# Altium footprint library RDM_ALT_PCB.PcbLib: 171 footprints (part 11 of 11)
Each footprint in its own frame and in the unit in brackets; x right, y up, seen from the top. Pads: shape width x height; smd on the part's side, far side on the other; paste and mask are expansions set on the pad; w line width, h text height; cw(c..) or ccw(c..) is an arc to the next point about the centre after c.
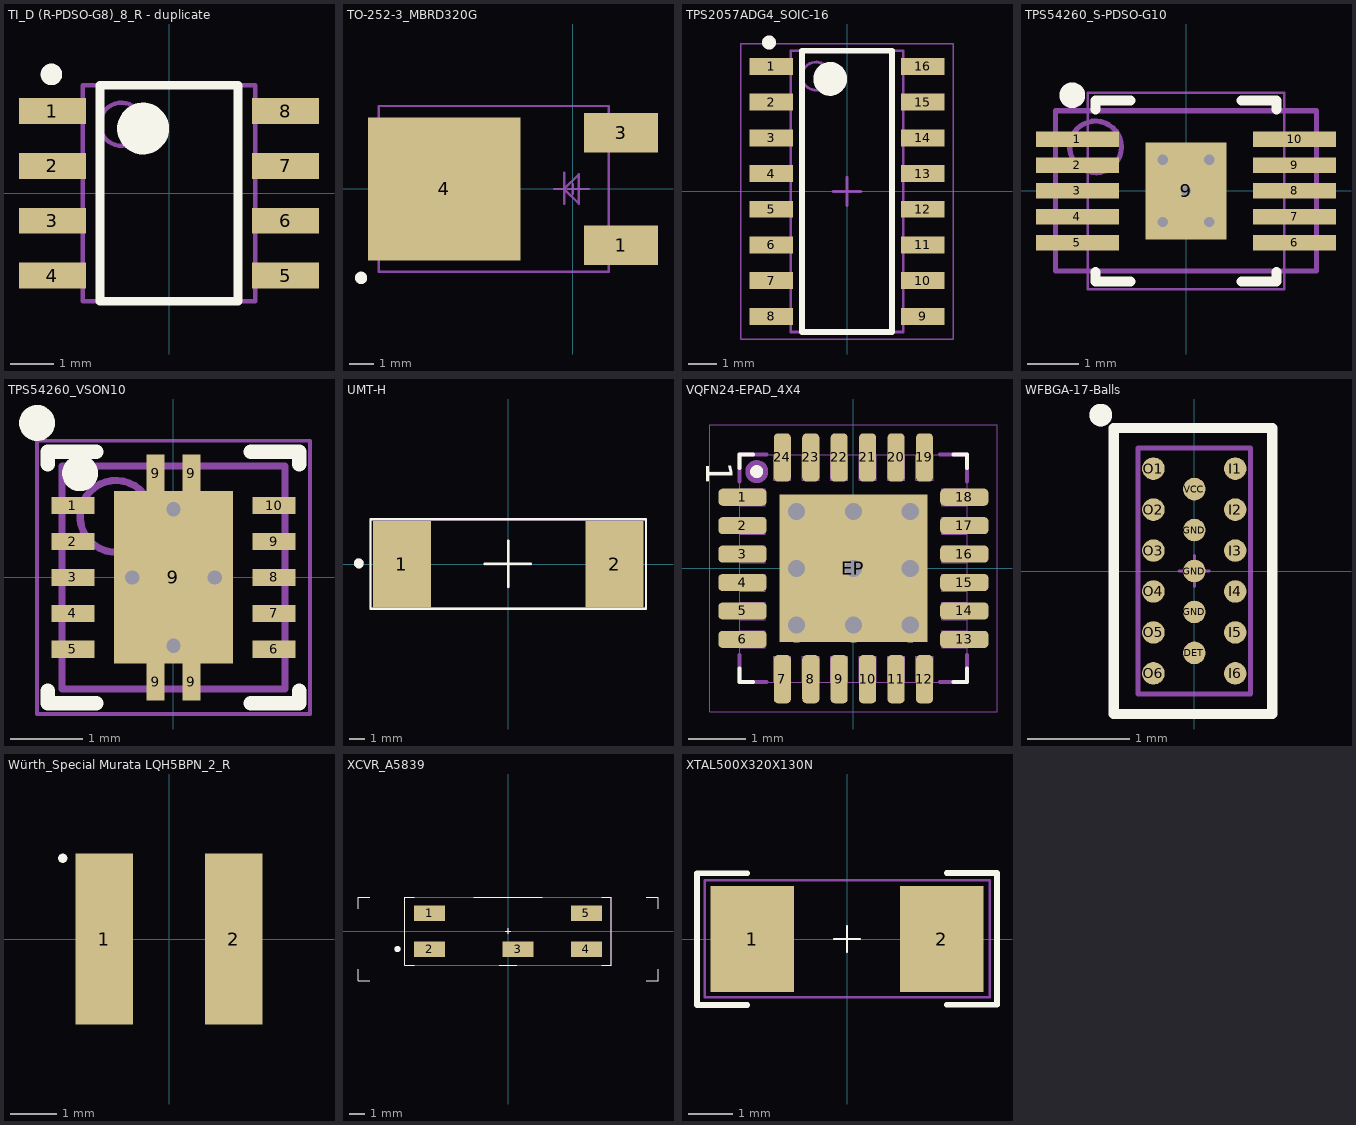
[diagram p10: the footprints below, top view; thin cyan lines are the x and y axes]

## TI_D (R-PDSO-G8)_8_R - duplicate [mm] "TI_D (R-PDSO-G8)_8_R"
height 1.75
pads (8):
  rect 1.55x0.6 smd: 1(-2.7,1.905) 2(-2.7,0.635) 3(-2.7,-0.635) 4(-2.7,-1.905) 5(2.7,-1.905) 6(2.7,-0.635) 7(2.7,0.635) 8(2.7,1.905)
Top Overlay:
  circle w0.6: c-0.6,1.5 r0.3
  circle w0.25: c-2.725,2.755 r0.125
  lines w0.2: -1.6,-2.5 1.6,-2.5 1.6,2.5 -1.6,2.5 -1.6,-2.5
Mechanical 13:
  circle w0.1: c-1.1,1.6 r0.5
  lines w0.1: -2,-2.5 2,-2.5 2,2.5 -2,2.5 -2,-2.5
3D body "SOIC-8akaD0008AakaM08A.stp": height 1.63, standoff 0, extent -3,-2.45 3,2.45

## TO-252-3_MBRD320G [mm] "TO-252-3_MBRD320G"
height 2.47
pads (3):
  rect 3x1.6 smd: 1(1.959,-2.285) 3(1.959,2.285)
  rect 6.2x5.8 smd: 4(-5.221,0)
Top Overlay:
  circle w0.25: c-8.593,-3.607 r0.125
Mechanical 1:
  lines w0.1: -0.2,0 0.2,0 ; 0,-0.2 0,0.2
Mechanical 13:
  lines w0.1: -7.871,-3.363 -7.871,3.369 1.466,3.369 1.466,-3.363 -7.871,-3.363
Mechanical 15:
  lines w0.1: -0.75,0 -0.35,0 ; -0.35,-0.6 -0.35,0.6 -0.35,0.65 ; 0.25,0 0.65,0 ; -0.35,0 0.25,0.6 0.25,-0.6 -0.35,0
3D body "DPAK.step": height 2.44, standoff 0, extent -7.871,-3.363 1.466,3.369

## TPS2057ADG4_SOIC-16 [mm] "SOIC, 16-Leads, Body 10.00x4.00mm, Pitch 1.27mm, IPC Medium Density"
height 1.75
pads (16):
  rect 1.55x0.6 smd: 1(-2.7,4.445) 2(-2.7,3.175) 3(-2.7,1.905) 4(-2.7,0.635) 5(-2.7,-0.635) 6(-2.7,-1.905) 7(-2.7,-3.175) 8(-2.7,-4.445) 9(2.7,-4.445) 10(2.7,-3.175) 11(2.7,-1.905) 12(2.7,-0.635) 13(2.7,0.635) 14(2.7,1.905) 15(2.7,3.175) 16(2.7,4.445)
Top Overlay:
  circle w0.6: c-0.6,4 r0.3
  circle w0.25: c-2.775,5.295 r0.125
  lines w0.2: -1.6,-5 1.6,-5 1.6,5 -1.6,5 -1.6,-5
Mechanical 13:
  circle w0.1: c-1.1,4.1 r0.5
  lines w0.1: -2,-5 2,-5 2,5 -2,5 -2,-5
Mechanical 15:
  lines w0.05: -3.775,-5.25 3.775,-5.25 3.775,5.25 -3.775,5.25 -3.775,-5.25
  lines w0.1: -0.5,0 0.5,0 ; 0,-0.5 0,0.5
3D body "D16.stp": height 1.76, standoff 0, extent -3.099,-5.004 3.099,5.004

## TPS54260_S-PDSO-G10 [mm] "PSO Package  10-Pin"
height 1.1
pads (11):
  rect 1.6x0.3 smd paste-0.025 mask+0.07: 1(-2.1,1) 2(-2.1,0.5) 3(-2.1,0) 4(-2.1,-0.5) 5(-2.1,-1) 6(2.1,-1) 7(2.1,-0.5) 8(2.1,0) 9(2.1,0.5) 10(2.1,1)
  rect 1.57x1.88 smd: 9(0,0)
via 0.45,0.6 diameter 0.3 hole 0.2
via 0.45,-0.6 diameter 0.3 hole 0.2
via -0.45,-0.6 diameter 0.3 hole 0.2
via -0.45,0.6 diameter 0.3 hole 0.2
via 0,0 diameter 0.3 hole 0.2
Top Overlay:
  circle w0.25: c-2.2,1.85 r0.125
  lines w0.2: -1.75,-1.575 -1.75,-1.75 -1.075,-1.75 ; -1.75,1.575 -1.75,1.75 -1.075,1.75 ; 1.075,-1.75 1.75,-1.75 1.75,-1.575 ; 1.075,1.75 1.75,1.75 1.75,1.575
Mechanical 13:
  circle w0.1: c-1.75,0.85 r0.5
  lines w0.1: -2.525,-1.55 2.525,-1.55 2.525,1.55 -2.525,1.55 -2.525,-1.55
Mechanical 15:
  lines w0.05: -1.9,-1.9 1.9,-1.9 1.9,1.9 -1.9,1.9 -1.9,-1.9
  lines w0.1: -0.5,0 0.5,0 ; 0,-0.5 0,0.5
3D body "DGQ10_1P88X1P57.step": height 1.7, standoff 0, extent -2.525,-1.55 2.525,1.55

## TPS54260_VSON10 [mm] "DRC Package  10-Pin VSON"
height 1
pads (15):
  rect 0.6x0.24 smd mask+0.07: 1(-1.4,1) 2(-1.4,0.5) 3(-1.4,0) 4(-1.4,-0.5) 5(-1.4,-1) 6(1.4,-1) 7(1.4,-0.5) 8(1.4,0) 9(1.4,0.5) 10(1.4,1)
  rect 0.25x0.52 smd mask+0.07: 9(-0.25,-1.45) 9(-0.25,1.45) 9(0.25,-1.45) 9(0.25,1.45)
  rect 1.65x2.4 smd: 9(0,0)
via 0.575,0 diameter 0.3 hole 0.2
via 0,0.95 diameter 0.3 hole 0.2
via 0,-0.95 diameter 0.3 hole 0.2
via -0.575,0 diameter 0.3 hole 0.2
Top Overlay:
  circle w0.25: c-1.3,1.45 r0.125
  circle w0.25: c-1.9,2.15 r0.125
  lines w0.2: -1.75,-1.575 -1.75,-1.75 -1.075,-1.75 ; -1.75,1.575 -1.75,1.75 -1.075,1.75 ; 1.075,-1.75 1.75,-1.75 1.75,-1.575 ; 1.075,1.75 1.75,1.75 1.75,1.575
Mechanical 13:
  circle w0.1: c-0.8,0.85 r0.5
  lines w0.1: -1.55,-1.55 -1.55,1.55 1.55,1.55 1.55,-1.55 -1.55,-1.55
Mechanical 15:
  lines w0.05: -1.9,-1.9 -1.9,1.9 1.9,1.9 1.9,-1.9 -1.9,-1.9
  lines w0.1: -0.5,0 0.5,0 ; 0,-0.5 0,0.5
3D body "DRC10_2P4X1P65.stp": height 1, standoff 0, extent -1.55,-1.55 1.55,1.55

## UMT-H [mm]
pads (2):
  rect 3.75x5.6 smd: 1(-6.875,0) 2(6.875,0)
Top Overlay:
  circle w0.54: c-9.663,0.054 r0.05
  lines w0.15: -8.9,-2.89 8.9,-2.89 8.9,2.89 ; -8.9,-2.88 -8.9,2.91 8.9,2.91 ; -1.53,0.03 1.47,0.03 ; -0.01,-1.47 -0.01,1.53
Mechanical 13:
  circle w0.54: c-9.66,0.05 r0.05
Mechanical 15:
  circle w0.54: c-9.663,0.054 r0.05
  lines w0.15: -1.53,0 1.47,0 ; -0.01,-1.5 -0.01,1.5 ; -8.9,-2.89 -8.9,2.91 8.9,2.91 8.9,-2.89 -8.9,-2.89
3D body "e_0100.3446d003.step": height 5.36, standoff 0, extent -8.05,-2.675 8.15,2.675

## VQFN24-EPAD_4X4 [mm] "Transceiver Ethernet 24-SQFN"
height 1
pads (25):
  rrect50% 0.85x0.3 smd mask+0.05: 1(-1.95,1.25) 2(-1.95,0.75) 3(-1.95,0.25) 4(-1.95,-0.25) 5(-1.95,-0.75) 6(-1.95,-1.25) 13(1.95,-1.25) 14(1.95,-0.75) 15(1.95,-0.25) 16(1.95,0.25) 17(1.95,0.75) 18(1.95,1.25)
  rrect50% 0.3x0.85 smd mask+0.05: 7(-1.25,-1.95) 8(-0.75,-1.95) 9(-0.25,-1.95) 10(0.25,-1.95) 11(0.75,-1.95) 12(1.25,-1.95) 19(1.25,1.95) 20(0.75,1.95) 21(0.25,1.95) 22(-0.25,1.95) 23(-0.75,1.95) 24(-1.25,1.95)
  rect 2.6x2.6 smd paste-10 mask+0.05: EP(0,0)
via 0,0 diameter 0.6 hole 0.3
via -1,0 diameter 0.6 hole 0.3
via -1,1 diameter 0.6 hole 0.3
via 0,1 diameter 0.6 hole 0.3
via 1,1 diameter 0.6 hole 0.3
via 1,0 diameter 0.6 hole 0.3
via 1,-1 diameter 0.6 hole 0.3
via 0,-1 diameter 0.6 hole 0.3
via -1,-1 diameter 0.6 hole 0.3
Top Overlay:
  circle w0.178: c-1.7,1.7 r0.025
  lines w0.07: -2,-1.763 -2,-2 -1.763,-2 ; -2,1.763 -2,2 -1.762,2 ; 1.763,-2 2,-2 2,-1.763 ; 1.763,2 2,2 2,1.763
  text "1" at -2.75,1.877 h0.8
Top Paste:
  rectangle: -0.875,-0.875 -0.125,-0.125
  rectangle: 0.125,-0.875 0.875,-0.125
  rectangle: 0.125,0.125 0.875,0.875
  rectangle: -0.875,0.125 -0.125,0.875
Mechanical 13:
  circle w0.254: c-1.7,1.7 r0.075
  lines w0.01: -2.525,-2.525 -2.525,2.525 2.525,2.525 2.525,-2.525 -2.525,-2.525
  lines w0.05: -0.238,0 0.238,0 ; 0,-0.238 0,0.238
  lines w0.07: -2,-1.525 -2,-2 -1.525,-2 ; -2,1.525 -2,2 -1.525,2 ; 1.525,-2 2,-2 2,-1.525 ; 1.525,2 2,2 2,1.525
Mechanical 15:
  circle w0.254: c-1.7,1.7 r0.075
  lines w0.01: -2,-1.4 -1.55,-1.4 -1.55,-1.1 -2,-1.1 ; -2,-0.9 -1.55,-0.9 -1.55,-0.6 -2,-0.6 ; -2,-0.4 -1.55,-0.4 -1.55,-0.1 -2,-0.1 ; -2,0.1 -1.55,0.1 -1.55,0.4 -2,0.4 ; -2,0.6 -1.55,0.6 -1.55,0.9 -2,0.9 ; -2,1.1 -1.55,1.1 -1.55,1.4 -2,1.4 ; -1.4,-2 -1.4,-1.55 -1.1,-1.55 -1.1,-2 ; -1.4,2 -1.4,1.55 -1.1,1.55 -1.1,2 ; -0.9,-2 -0.9,-1.55 -0.6,-1.55 -0.6,-2 ; -0.9,2 -0.9,1.55 -0.6,1.55 -0.6,2 ; -0.4,-2 -0.4,-1.55 -0.1,-1.55 -0.1,-2 ; -0.4,2 -0.4,1.55 -0.1,1.55 -0.1,2 ; 0.1,-2 0.1,-1.55 0.4,-1.55 0.4,-2 ; 0.1,2 0.1,1.55 0.4,1.55 0.4,2 ; 0.6,-2 0.6,-1.55 0.9,-1.55 0.9,-2 ; 0.6,2 0.6,1.55 0.9,1.55 0.9,2 ; 1.1,-2 1.1,-1.55 1.4,-1.55 1.4,-2 ; 1.1,2 1.1,1.55 1.4,1.55 1.4,2 ; 2,-1.4 1.55,-1.4 1.55,-1.1 2,-1.1 ; 2,-0.9 1.55,-0.9 1.55,-0.6 2,-0.6 ; 2,-0.4 1.55,-0.4 1.55,-0.1 2,-0.1 ; 2,0.1 1.55,0.1 1.55,0.4 2,0.4 ; 2,0.6 1.55,0.6 1.55,0.9 2,0.9 ; 2,1.1 1.55,1.1 1.55,1.4 2,1.4 ; -2.525,-2.525 -2.525,2.525 2.525,2.525 2.525,-2.525 -2.525,-2.525 ; -2,-2 2,-2 2,2 -2,2 -2,-2 ; -1.25,-1.25 1.25,-1.25 1.25,1.25 -1.25,1.25 -1.25,-1.25
  lines w0.05: -0.238,0 0.238,0 ; 0,-0.238 0,0.238
  lines w0.07: -2,-1.525 -2,-2 -1.525,-2 ; -2,1.525 -2,2 -1.525,2 ; 1.525,-2 2,-2 2,-1.525 ; 1.525,2 2,2 2,1.525
  text "'.Designator'" at -2,0.25 h0.75
  text "25" at -0.305,-0.838 h0.65
  text "18" at 2.45,0.975 h0.65
  text "13" at 2.45,-1.525 h0.65
  text "19" at 0.975,2.05 h0.65
  text "12" at 0.975,-2.45 h0.65
  text "24" at -1.575,2.05 h0.65
  text "7" at -1.4,-2.45 h0.65
  text "1" at -2.475,1.325 h0.65
  text "6" at -2.45,-1.125 h0.65
3D body: height 1, standoff 0, extent -2,-2 2,2
3D body "VQFN24-EPAD.STEP": height 1.05, standoff -0.03, extent -2.05,-2.05 2.05,2.05
3D body: height 1.1, standoff 1, extent -1.448,1.051 -1.05,1.45

## WFBGA-17-Balls [mm] "EMIF06-HSD03F3, EMI/RFI-FILTER"
pads (17):
  round 0.22 smd: DET(0,-0.8) GND(0,-0.4) GND(0,0) GND(0,0.4) I1(0.4,1) I2(0.4,0.6) I3(0.4,0.2) I4(0.4,-0.2) I5(0.4,-0.6) I6(0.4,-1) O1(-0.4,1) O2(-0.4,0.6) O3(-0.4,0.2) O4(-0.4,-0.2) O5(-0.4,-0.6) O6(-0.4,-1) VCC(0,0.8)
Top Overlay:
  circle w0.2: c-0.914,1.524 r0.01
  lines w0.102: -0.787,-1.397 0.762,-1.397 0.762,1.397 -0.787,1.397 -0.787,-1.397
Top Paste:
  region: -0.51,-0.89 -0.29,-0.89 -0.29,-1.11 -0.51,-1.11
  region: -0.51,-0.49 -0.29,-0.49 -0.29,-0.71 -0.51,-0.71
  region: -0.511,-0.09 -0.29,-0.09 -0.29,-0.311 -0.511,-0.311
  region: -0.511,0.31 -0.29,0.31 -0.29,0.09 -0.511,0.09
  region: -0.511,0.71 -0.29,0.71 -0.29,0.491 -0.511,0.491
  region: -0.511,1.11 -0.29,1.11 -0.29,0.892 -0.511,0.892
  region: 0.29,-0.89 0.51,-0.89 0.51,-1.111 0.29,-1.111
  region: 0.29,-0.49 0.51,-0.49 0.51,-0.711 0.29,-0.711
  region: 0.29,-0.09 0.51,-0.09 0.51,-0.31 0.29,-0.31
  region: 0.29,0.31 0.51,0.31 0.51,0.09 0.29,0.09
  region: 0.291,0.71 0.51,0.71 0.51,0.491 0.291,0.491
  region: 0.29,1.11 0.51,1.11 0.51,0.891 0.29,0.891
  region: -0.11,-0.29 0.11,-0.29 0.11,-0.51 -0.11,-0.51
  region: -0.11,-0.69 0.11,-0.69 0.11,-0.911 -0.11,-0.911
  region: -0.11,0.91 0.11,0.91 0.11,0.691 -0.11,0.691
  region: -0.11,0.51 0.11,0.51 0.11,0.29 -0.11,0.29
  region: -0.11,0.11 0.11,0.11 0.11,-0.11 -0.11,-0.11
Top Solder:
  circle w0.2: c-0.4,-1 r0.05
  circle w0.2: c-0.4,-0.6 r0.05
  circle w0.2: c-0.4,-0.2 r0.05
  circle w0.2: c-0.4,0.2 r0.05
  circle w0.2: c-0.4,0.6 r0.05
  circle w0.2: c-0.4,1 r0.05
  circle w0.2: c0.4,-1 r0.05
  circle w0.2: c0.4,-0.6 r0.05
  circle w0.2: c0.4,-0.2 r0.05
  circle w0.2: c0.4,0.2 r0.05
  circle w0.2: c0.4,0.6 r0.05
  circle w0.2: c0.4,1 r0.05
  circle w0.2: c0,-0.4 r0.05
  circle w0.2: c0,-0.8 r0.05
  circle w0.2: c0,0.8 r0.05
  circle w0.2: c0,0.4 r0.05
  circle w0.2: c0,0 r0.05
Mechanical 4:
  circle w0.08: c-0.4,1 r0.05
  circle w0.08: c-0.4,1 r0.05
Mechanical 13:
  circle w0.2: c-0.914,1.524 r0.01
  lines w0.03: -0.15,0 0.15,0 ; 0,-0.15 0,0.15
  lines w0.05: -0.55,-1.2 -0.55,1.2 0.55,1.2 0.55,-1.2 -0.55,-1.2
Mechanical 15:
  circle w0.2: c-0.914,1.524 r0.01
  lines w0.03: -0.15,0 0.15,0 -0.15,0 ; 0,-0.15 0,0.15 0,-0.15
  lines w0.05: -0.55,-1.2 0.55,-1.2 0.55,1.2 -0.55,1.2 -0.55,-1.2
3D body: height 0.6, standoff 0.02, extent -0.55,-1.2 0.55,1.2

## Würth_Special Murata LQH5BPN_2_R [mm] "Würth_Special Murata LQH5BPN_2_R"
height 4
pads (2):
  rect 1.25x3.7 smd: 1(-1.4,0) 2(1.4,0)
Top Overlay:
  circle w0.2: c-2.3,1.75 r0
3D body "STEP-WE-MAPI-4030-rev1.stp": height 3.1, standoff 0, extent -2.05,-2.05 2.05,2.05
3D body: height 4, standoff 0, extent -2.45,-2.45 2.45,2.45

## XCVR_A5839 [mm] "RF ANT 2.4GHZ Antenova"
pads (5):
  rect 2x1 smd: 1(-5.05,1.15) 2(-5.05,-1.15) 3(0.65,-1.15) 4(5.05,-1.15) 5(5.05,1.15)
Top Overlay:
  circle w0.2: c-7.107,-1.151 r0.1
  lines w0.05: -9.65,-2.45 -9.65,-3.2 -8.9,-3.2 ; -9.65,1.45 -9.65,2.2 ; -9.631,2.2 -8.881,2.2 ; -6.04,-2.2 -6.65,-2.2 -6.65,2.2 -6.04,2.2 ; -2.2,2.2 2.2,2.2 ; -0.55,-2.2 0.55,-2.2 ; -0.175,0.001 0.175,0.001 ; 0,-0.174 0,0.176 ; 6.04,-2.2 6.65,-2.2 6.65,2.2 6.04,2.2 ; 8.9,-3.2 9.65,-3.2 9.65,-2.45 ; 8.9,2.2 9.65,2.2 9.65,1.45
Mechanical 13:
  circle w0.2: c-7.107,-1.151 r0.1
  lines w0.05: -0.175,0 0.175,0 ; 0,-0.175 0,0.175 ; -6.65,-2.2 6.65,-2.2 6.65,2.2 -6.65,2.2 -6.65,-2.2
Mechanical 15:
  circle w0.2: c-7.107,-1.151 r0.1
  lines w0.05: -6.65,-2.2 6.65,-2.2 ; -0.175,0 0.175,0 ; 0,-0.175 0,0.175
3D body: height 1.31, standoff 0.81, extent -6.439,-1.312 -5.443,-0.314
3D body: height 1.3, standoff 0, extent -6.65,-2.2 6.65,2.2

## XTAL500X320X130N [mm]
pads (2):
  rect 1.9x2.4 smd: 1(-2.15,0) 2(2.15,0)
Top Overlay:
  lines w0.05: -0.29,-0.002 0.291,0.001 ; -0.001,0.29 0.002,-0.291
  lines w0.127: -2.261,-1.499 -3.404,-1.499 -3.404,1.496 -2.261,1.496 ; 2.261,-1.496 3.404,-1.496 3.404,1.499 2.261,1.499
Mechanical 13:
  lines w0.05: -0.29,-0.002 0.291,0.001 ; -0.001,0.29 0.002,-0.291 ; -3.226,-1.323 -3.226,1.329 3.234,1.329 3.234,-1.323 -3.226,-1.323
Mechanical 15:
  lines w0.05: -0.289,-0.003 0.292,0 ; 0,0.289 0.003,-0.292 ; -3.226,-1.32 3.237,-1.32 3.237,1.332 -3.226,1.332 -3.226,-1.32
3D body "ABS07-120-32.768KHZ-T--3DModel-STEP-56544.STEP": height 0.91, standoff 0.01, extent -1.6,-0.75 1.6,0.75